# Altium footprint library DrPCB.PcbLib: 910 footprints (part 15 of 57)
Each footprint in its own frame and in the unit in brackets; x right, y up, seen from the top. Pads: shape width x height; smd on the part's side, far side on the other; paste and mask are expansions set on the pad; w line width, h text height; cw(c..) or ccw(c..) is an arc to the next point about the centre after c.
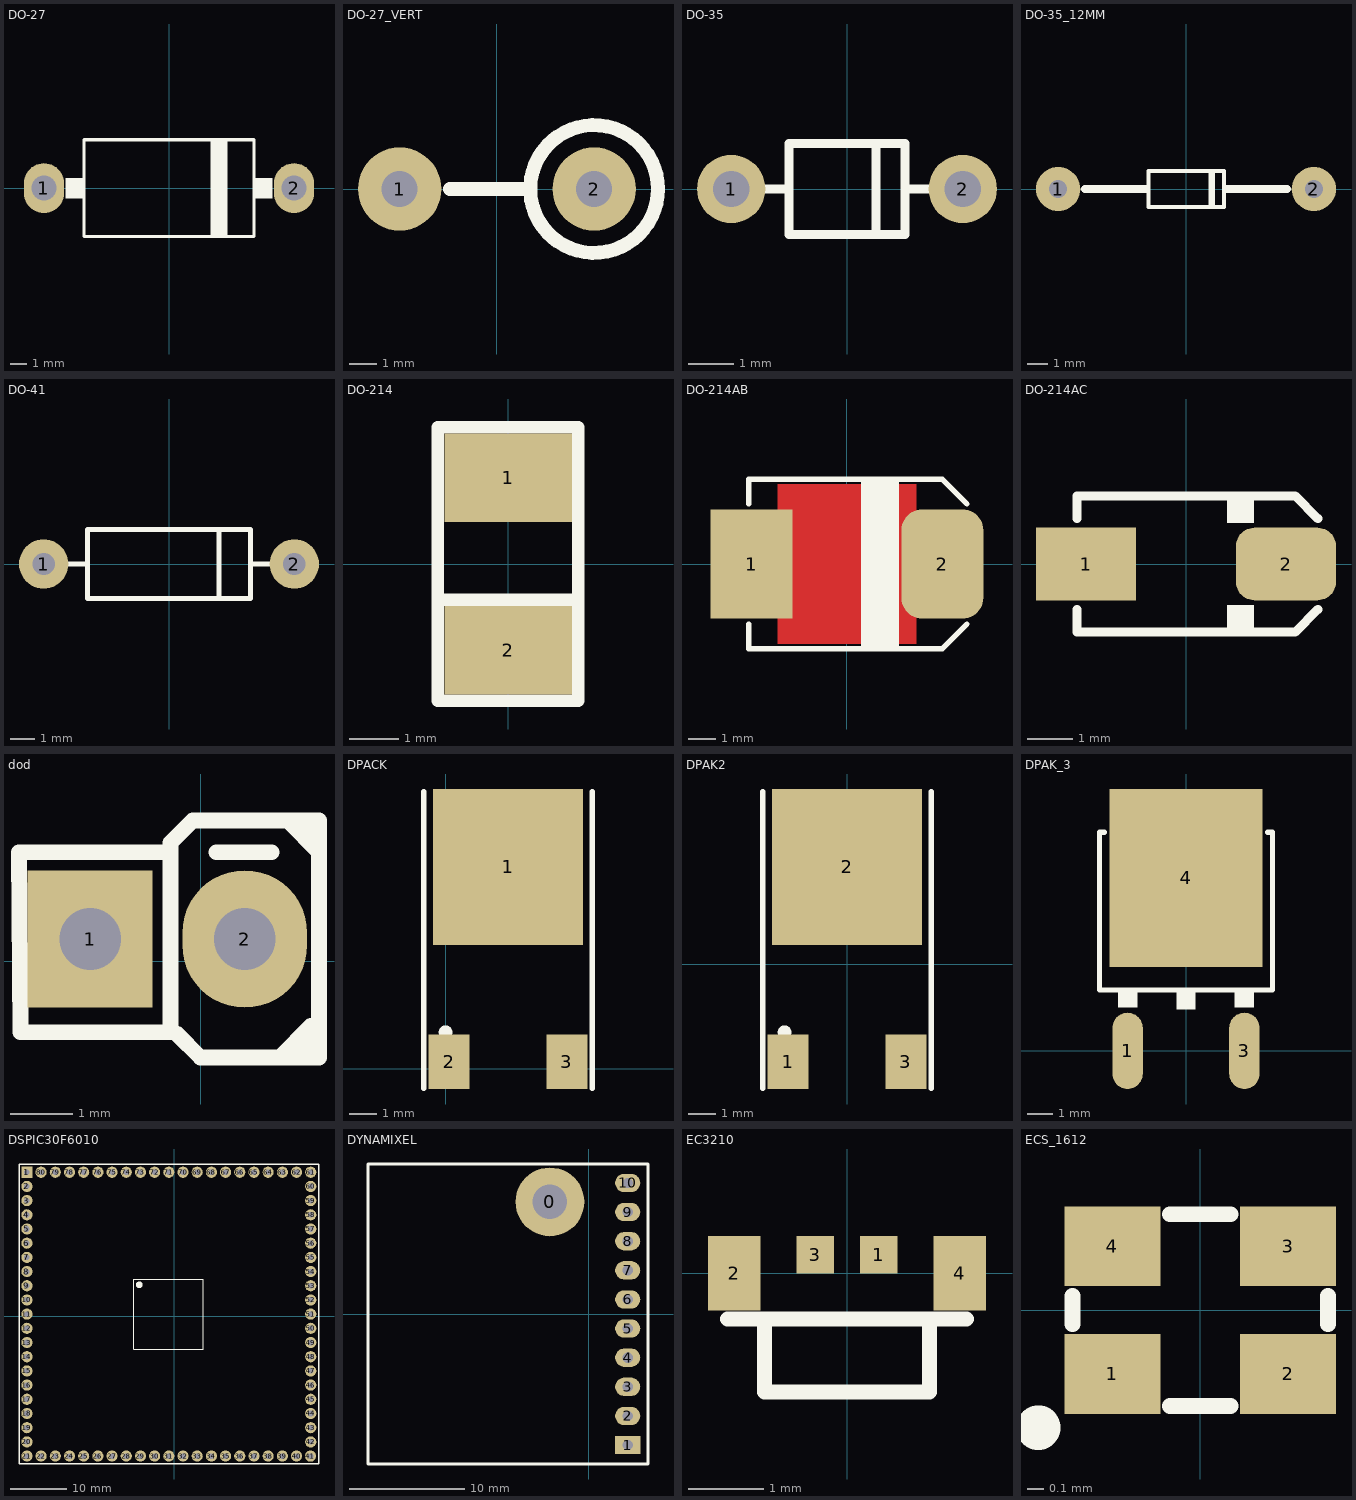
[diagram p14: the footprints below, top view; thin cyan lines are the x and y axes]

## DO-27 [mm] "DIODE 0.6 INCH SPACING A-500 (Vishay)  DO-201A DO-27 BYW98"
pads (2):
  oval 2.4x3 hole 1.5: 1(-7.5,0) 2(7.5,0)
Top Overlay:
  rectangle: 2.5,-3 3.5,2.9
  region: 6.2,0.6 5.1,0.6 5.1,-0.6 6.2,-0.6
  region: -6.2,0.6 -5.1,0.6 -5.1,-0.6 -6.2,-0.6
  lines w0.2: -5.1,-2.9 5.1,-2.9 5.1,2.9 -5.1,2.9 -5.1,-2.9
3D body "User Library-DO-201AD.STEP": height 7.6, standoff -4, extent -8.28,-2.8 8.28,2.8

## DO-27_VERT [mm]
pads (2):
  round 3 hole 1.3: 1(-3.5,0) 2(3.5,0)
Top Overlay:
  circle w0.5: c3.5,0 r2.3
  lines w0.5: -1.69,0 1.168,0
3D body "User Library-DO-27-2.step": height 14.9, standoff -8, extent -4.106,-2.513 5.994,2.487

## DO-35 [mm] "DIODE 0.2 INCH SPACING DO-35, 1N4148"
height 1.8
pads (2):
  round 1.5 hole 0.8: 1(-2.54,0) 2(2.54,0)
Top Overlay:
  lines w0.2: -1.905,0 -1.27,0 ; 0.635,-1 0.635,1 ; 1.27,0 1.93,0 ; -1.27,-1 -1.27,1 1.27,1 1.27,-1 -1.27,-1
3D body "User Library-DO-35G-20.step": height 1.82, standoff -2, extent -2.815,-0.898 2.815,0.898

## DO-35_12MM [mm]
pads (2):
  round 2.2 hole 0.9: 1(-6.35,0) 2(6.35,0)
Top Overlay:
  rectangle: 1.118,-0.965 1.448,0.927
  lines w0.2: -1.867,-0.902 -1.867,0.902 1.892,0.902 1.892,-0.902 -1.867,-0.902
  lines w0.4: -5.016,0 -1.968,0 ; 1.994,0 5.016,0
3D body "User Library-DO-35G-50.step": height 1.82, standoff -2, extent -6.625,-0.901 6.625,0.901

## DO-41 [mm] "DIODE 0.4 INCH SPACING DO-41"
pads (2):
  round 2 hole 0.9: 1(-5.08,0) 2(5.08,0)
Top Overlay:
  lines w0.2: -4.2,0 -3.302,0 ; 2.032,-1.27 2.032,1.27 ; 3.302,0 4.2,0 ; -3.302,-1.4 3.302,-1.4 3.302,1.4 -3.302,1.4 -3.302,-1.4
3D body "User Library-DO-41-4.step": height 2.85, standoff -2.35, extent -5.68,-1.32 5.68,1.4

## DO-214 [mm]
pads (2):
  rect 2.6x1.8 smd: 1(0,1.75) 2(0,-1.75)
Top Overlay:
  lines w0.254: -1.422,-0.724 1.41,-0.724 ; -1.435,-2.781 1.422,-2.781 1.422,2.781 -1.435,2.781 -1.435,-2.781

## DO-214AB [mm] "SMC, Molded Diode, 7.0x6.0mm"
height 3
pads (2):
  rect 3x4 smd paste-3: 1(-3.5,0)
  rrect50% 3x4 smd paste-3: 2(3.5,0)
Top Layer:
  pour cut-out: -2.54,2.921 -2.54,-2.921 2.54,-2.921 2.54,2.921
Top Overlay:
  rectangle: 0.508,-3.048 1.905,3.048
  lines w0.2: -3.6,-2.2 -3.6,-3.1 3.5,-3.1 4.4,-2.2 ; -3.6,2.2 -3.6,3.1 3.5,3.1 4.4,2.2
Top Paste:
  rectangle: -4.7,0.8 -3.7,1.8
  rectangle: -3.3,0.8 -2.3,1.8
  rectangle: -3.3,-0.5 -2.3,0.5
  rectangle: -4.7,-0.5 -3.7,0.5
  rectangle: -4.7,-1.8 -3.7,-0.8
  rectangle: -3.3,-1.8 -2.3,-0.8
  region: 3.3,-0.8 2.3,-0.8 2.3,-1.8 3.3,-1.8
  region: 4.7,-0.8 3.7,-0.8 3.7,-1.8 4.7,-1.8
  region: 4.7,0.5 3.7,0.5 3.7,-0.5 4.7,-0.5
  region: 3.3,0.5 2.3,0.5 2.3,-0.5 3.3,-0.5
  region: 3.3,1.8 2.3,1.8 2.3,0.8 3.3,0.8
  region: 4.7,1.8 3.7,1.8 3.7,0.8 4.7,0.8
3D body "User Library-DIOM8261X24.step": height 2.4, standoff 0.03, extent -4.065,-3.05 4.065,3.05

## DO-214AC [mm] "SMA Molded Diode, 2-Leads, Body 4.3x2.7mm, SOD-128"
height 2.4
pads (2):
  rect 2.2x1.6 smd paste-0.1: 1(-2.2,0)
  rrect50% 2.2x1.6 smd paste-0.1: 2(2.2,0)
Top Overlay:
  rectangle: 0.9,-1.5 1.5,-0.9
  rectangle: 0.9,0.9 1.5,1.5
  lines w0.2: -2.4,-1 -2.4,-1.5 2.4,-1.5 2.9,-1 ; -2.4,1 -2.4,1.5 2.4,1.5 2.9,1
3D body "User Library-DIOM5528X26.step": height 2.6, standoff 0.03, extent -2.75,-1.4 2.75,1.4

## dod [mil]
pads (2):
  rect 79.02x87.01 hole 39.02: 1(-70.07,14.16)
  oval 79x87 hole 39: 2(27.93,14.16)
Top Overlay:
  lines w10: -15.07,-45.84 -0.07,-60.84 74.93,-60.84 74.93,89.16 -5.07,89.16 -19.07,75.16 -19.07,69.16 ; 9.93,69.16 44.93,69.16 ; 49.93,-60.84 69.93,-40.84 74.93,-40.84 ; 59.93,-60.84 74.93,-45.84 ; 59.93,89.16 54.93,89.16 74.93,69.16 ; 64.93,89.16 74.93,79.16 ; -19.07,69.16 -19.07,-44.84 -114.07,-44.84 -115.07,69.16 -19.07,69.16

## DPACK [mm]
pads (3):
  rect 5.5x5.7 smd: 1(2.286,7.383)
  rect 1.5x2 smd: 2(0.127,0.254) 3(4.445,0.254)
Top Overlay:
  circle w0.25: c0.001,1.333 r0.125
  lines w0.2: -0.799,-0.717 -0.799,10.133 ; 5.371,-0.717 5.371,10.133

## DPAK2 [mm]
pads (3):
  rect 1.5x2 smd: 1(-2.159,-3.564) 3(2.159,-3.564)
  rect 5.5x5.7 smd: 2(0,3.565)
Top Overlay:
  circle w0.25: c-2.285,-2.485 r0.125
  lines w0.2: -3.085,-4.535 -3.085,6.315 ; 3.085,-4.535 3.085,6.315

## DPAK_3 [mm] "D-PAK (TO-252), 3-Pads, Body 6.2x6.7mm"
height 2.4
pads (3):
  oval 1.2x3 smd: 1(-2.3,0) 3(2.3,0)
  rect 6x7 smd paste-5: 4(0,6.8)
Top Overlay:
  rectangle: 1.905,1.7 2.667,2.394
  rectangle: -2.667,1.7 -1.905,2.394
  rectangle: -0.381,1.632 0.381,2.394
  lines w0.2: -3.2,8.6 -3.4,8.6 -3.4,2.4 3.4,2.4 3.4,8.6 3.2,8.6
Top Paste:
  rectangle: 0.2,4.9 1.2,5.9
  region: 1.2,6.3 1.2,7.3 0.2,7.3 0.2,6.3
  region: 2.6,5.9 1.6,5.9 1.6,4.9 2.6,4.9
  region: 1.2,4.5 0.2,4.5 0.2,3.5 1.2,3.5
  region: 2.6,3.5 2.6,4.5 1.6,4.5 1.6,3.5
  region: 1.6,7.3 1.6,6.3 2.6,6.3 2.6,7.3
  region: 2.6,7.7 2.6,8.7 1.6,8.7 1.6,7.7
  region: 1.2,8.7 0.2,8.7 0.2,7.7 1.2,7.7
  region: 2.6,10.1 1.6,10.1 1.6,9.1 2.6,9.1
  rectangle: 0.2,9.1 1.2,10.1
  region: -0.2,10.1 -1.2,10.1 -1.2,9.1 -0.2,9.1
  rectangle: -2.6,9.1 -1.6,10.1
  rectangle: -1.2,7.7 -0.2,8.7
  region: -1.6,7.7 -1.6,8.7 -2.6,8.7 -2.6,7.7
  region: -2.6,7.3 -2.6,6.3 -1.6,6.3 -1.6,7.3
  region: -1.6,3.5 -1.6,4.5 -2.6,4.5 -2.6,3.5
  rectangle: -1.2,3.5 -0.2,4.5
  rectangle: -2.6,4.9 -1.6,5.9
  region: -0.2,6.3 -0.2,7.3 -1.2,7.3 -1.2,6.3
  region: -0.2,5.9 -1.2,5.9 -1.2,4.9 -0.2,4.9
3D body "User Library-DPAK_TO-252AA.step": height 2.37, standoff -0.03, extent -3.367,-0.498 3.367,9.602

## DSPIC30F6010 [mm]
pads (80):
  rect 2x2 hole 1: 1(-26.41,25.81)
  round 2 hole 1: 2(-26.41,23.27) 3(-26.41,20.73) 4(-26.41,18.19) 5(-26.41,15.65) 6(-26.41,13.11) 7(-26.41,10.57) 8(-26.41,8.03) 9(-26.41,5.49) 10(-26.41,2.95) 11(-26.41,0.41) 12(-26.41,-2.13) 13(-26.41,-4.67) 14(-26.41,-7.21) 15(-26.41,-9.75) 16(-26.41,-12.29) 17(-26.41,-14.83) 18(-26.41,-17.37) 19(-26.41,-19.91) 20(-26.41,-22.45) 21(-26.41,-24.99) 22(-23.87,-24.99) 23(-21.33,-24.99) 24(-18.79,-24.99) 25(-16.25,-24.99) 26(-13.71,-24.99) 27(-11.17,-24.99) 28(-8.63,-24.99) 29(-6.09,-24.99) 30(-3.55,-24.99) 31(-1.01,-24.99) 32(1.53,-24.99) 33(4.07,-24.99) 34(6.61,-24.99) 35(9.15,-24.99) 36(11.69,-24.99) 37(14.23,-24.99) 38(16.77,-24.99) 39(19.31,-24.99) 40(21.85,-24.99) 41(24.346,-24.994) 42(24.39,-22.45) 43(24.39,-19.91) 44(24.39,-17.37) 45(24.39,-14.83) 46(24.39,-12.29) 47(24.39,-9.75) 48(24.39,-7.21) 49(24.39,-4.67) 50(24.39,-2.13) 51(24.39,0.41) 52(24.39,2.95) 53(24.39,5.49) 54(24.39,8.03) 55(24.39,10.57) 56(24.39,13.11) 57(24.39,15.65) 58(24.39,18.19) 59(24.39,20.73) 60(24.39,23.27) 61(24.39,25.81) 62(21.85,25.81) 63(19.31,25.81) 64(16.77,25.81) 65(14.23,25.81) 66(11.69,25.81) 67(9.15,25.81) 68(6.61,25.81) 69(4.07,25.81) 70(1.53,25.81) 71(-1.01,25.81) 72(-3.55,25.81) 73(-6.09,25.81) 74(-8.63,25.81) 75(-11.17,25.81) 76(-13.71,25.81) 77(-16.25,25.81) 78(-18.79,25.81) 79(-21.33,25.81) 80(-23.87,25.81)
Top Overlay:
  circle w0.6: c-6.304,5.656 r0.3
  lines w0.2: -7.304,-5.844 -7.304,6.656 5.196,6.656 5.196,-5.844 -7.304,-5.844
  lines w0.254: -27.819,-26.412 -27.819,27.283 25.864,27.283 25.864,-26.412 -27.819,-26.412

## DYNAMIXEL [mm]
pads (11):
  round 6 hole 3: 0(-3.391,9.779)
  rect 2.2x1.6 hole 0.9: 1(3.391,-11.43)
  oval 2.2x1.6 hole 0.9: 2(3.391,-8.89) 3(3.391,-6.35) 4(3.391,-3.81) 5(3.391,-1.27) 6(3.391,1.27) 7(3.391,3.81) 8(3.391,6.35) 9(3.391,8.89) 10(3.391,11.43)
Top Overlay:
  lines w0.254: -19.266,-13.081 5.169,-13.081 5.169,13.081 -19.266,13.081 -19.266,-13.056

## EC3210 [mm]
pads (4):
  rect 0.5x0.5 smd: 1(0.425,0.25) 3(-0.425,0.25)
  rect 0.7x1 smd: 2(-1.505,0) 4(1.505,0)
Top Overlay:
  lines w0.2: -1.6,-0.61 1.6,-0.61 ; -1.105,-0.622 -1.105,-1.587 1.105,-1.587 1.105,-0.61
3D body: height 1, standoff 0, extent -1.003,-1.486 1.003,-0.482
3D body: height 1, standoff 0, extent -1.6,-0.482 1.6,0

## ECS_1612 [mm]
pads (4):
  rect 0.6x0.5 smd: 1(-0.55,-0.4) 2(0.55,-0.4) 3(0.55,0.4) 4(-0.55,0.4)
Top Overlay:
  circle w0.254: c-1.016,-0.737 r0.013
  lines w0.1: -0.8,-0.089 -0.8,0.089 ; -0.191,-0.6 0.191,-0.6 ; -0.191,0.6 0.191,0.6 ; 0.8,-0.089 0.8,0.089
3D body: height 0.6, standoff 0, extent -0.851,-0.648 0.851,0.648